# Altium footprint library AltiumLibraries.PcbLib: 247 footprints (part 4 of 16)
Each footprint in its own frame and in the unit in brackets; x right, y up, seen from the top. Pads: shape width x height; smd on the part's side, far side on the other; paste and mask are expansions set on the pad; w line width, h text height; cw(c..) or ccw(c..) is an arc to the next point about the centre after c.
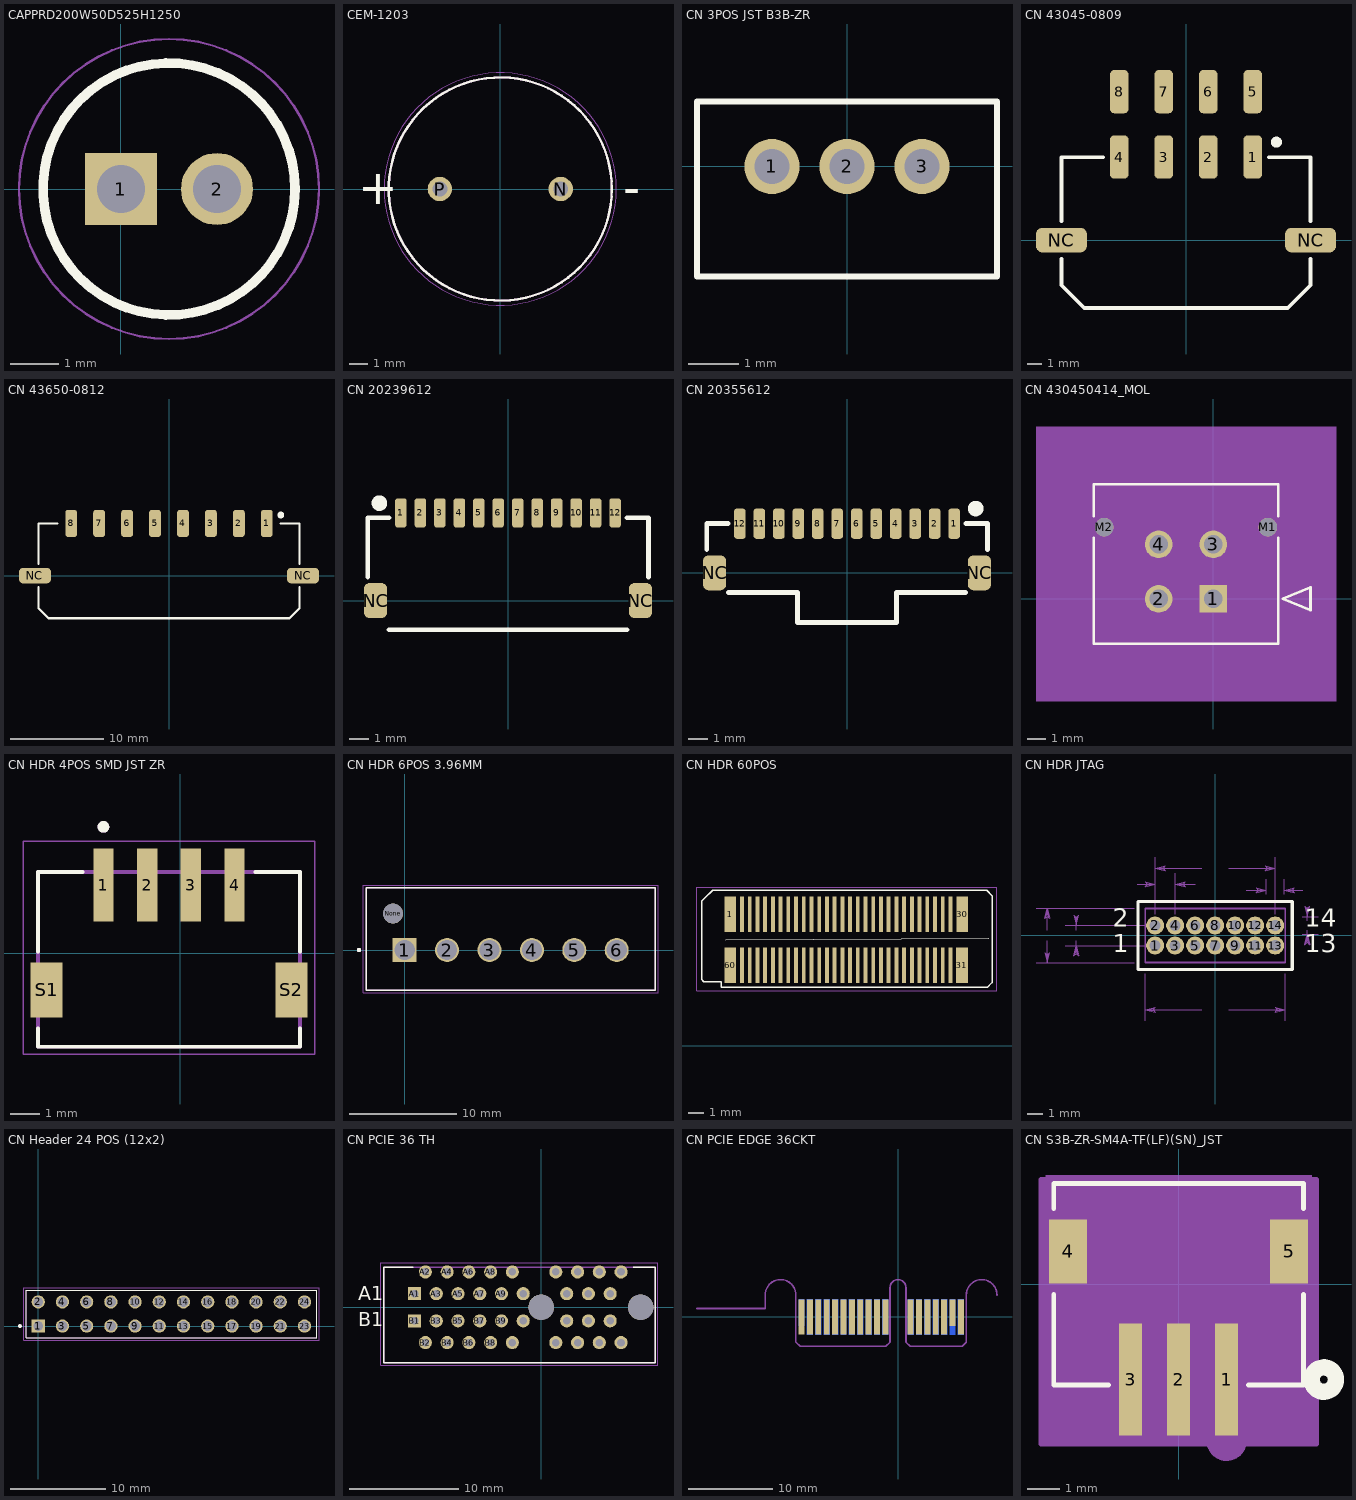
[diagram p3: the footprints below, top view; thin cyan lines are the x and y axes]

## CAPPRD200W50D525H1250 [mm]
pads (2):
  rect 1.5x1.5 hole 1: 1(0,0)
  round 1.5 hole 1: 2(2,0)
Top Overlay:
  circle w0.2: c1,0 r2.625
Mechanical 13:
  circle w0.1: c1,0 r2.625
Mechanical 15:
  circle w0.05: c1,0 r3.125
3D body "UKL2A0R1KDD.stp": height 12.5, standoff -10, extent -1.75,-2.75 3.75,2.75

## CEM-1203 [mm] "2048 Hz Speaker"
pads (2):
  round 1.308 hole 0.8: N(3.25,0) P(-3.25,0)
Top Overlay:
  circle w0.127: c0,0 r6
  text "-" at 6.608,-0.821 h1.88
  text "+" at -7.655,-0.821 h1.88
Mechanical 13:
  circle w0.127: c0,0 r6
  circle w0.127: c0,0 r6
Mechanical 16:
  circle w0.05: c0,0 r6.25
3D body "CEM-1203_42_WR.stp": height 9.1, standoff -5, extent -6.25,-6.251 6.25,6.249

## CN 3POS JST B3B-ZR [mm]
pads (3):
  round 1.1 hole 0.7: 1(-1.5,0) 2(0,0) 3(1.5,0)
Top Overlay:
  lines w0.127: -3,-2.2 3,-2.2 3,1.3 -3,1.3 -3,-2.2
3D body "step_temp.STEP": height 4.5, standoff -2.7, extent -3,-2.159 3,1.341

## CN 43045-0809 [mm] "Molex Micro-Fit 043045 SMD 8CKT"
pads (10):
  rrect50% 1.27x2.921 smd: 1(4.5,5.6) 2(1.5,5.6) 3(-1.5,5.6) 4(-4.5,5.6) 5(4.5,10) 6(1.5,10) 7(-1.5,10) 8(-4.5,10)
  rrect50% 3.429x1.651 smd: NC(-8.395,0) NC(8.395,0)
Top Overlay:
  circle w0.381: c6.096,6.604 r0.178
  lines w0.254: -8.382,-1.27 -8.382,-3.048 -6.858,-4.572 0,-4.572 6.858,-4.572 8.382,-3.048 8.382,-1.27 ; -8.382,1.27 -8.382,5.588 -5.588,5.588 ; 5.588,5.588 8.382,5.588 8.382,1.27
3D body "430450809.stp": height 8.73, standoff -0.04, extent -9.825,-4.605 9.825,10.795

## CN 43650-0812 [mm] "Molex Micro-Fit 043650 SMD 8CKT"
pads (10):
  rrect50% 1.27x2.921 smd: 1(10.5,5.6) 2(7.5,5.6) 3(4.5,5.6) 4(1.5,5.6) 5(-1.5,5.6) 6(-4.5,5.6) 7(-7.5,5.6) 8(-10.5,5.6)
  rrect50% 3.429x1.651 smd: NC(-14.385,0) NC(14.385,0)
Top Overlay:
  circle w0.381: c12,6.5 r0.178
  lines w0.254: -14,-1.27 -14,-3.5 -12.928,-4.572 0,-4.572 12.928,-4.572 14,-3.5 14,-1.27 ; -14,1.27 -14,5.588 -12,5.588 ; 12,5.588 14,5.588 14,1.27
3D body "436500812.stp": height 5.64, standoff -0.04, extent -15.82,-4.6 15.82,6.14

## CN 20239612 [mm] "12 Circuit SMD Right Angle PicoClasp"
pads (14):
  rrect50% 0.6x1.5 smd: 1(-5.5,4.5) 2(-4.5,4.5) 3(-3.5,4.5) 4(-2.5,4.5) 5(-1.5,4.5) 6(-0.5,4.5) 7(0.5,4.5) 8(1.5,4.5) 9(2.5,4.5) 10(3.5,4.5) 11(4.5,4.5) 12(5.5,4.5)
  rrect50% 1.2x1.8 smd: NC(-6.8,0) NC(6.8,0)
Top Overlay:
  circle w0.5: c-6.6,5 r0.15
  lines w0.254: -7.2,1.2 -7.2,4.25 -6.1,4.25 ; -6.1,-1.5 6.1,-1.5 ; 6.1,4.25 7.21,4.25 7.21,1.2
3D body "2023961207.stp": height 4.7, standoff 0, extent -7,-1.275 7,4.625

## CN 20355612 [mm] "12 Circuit SMD Right Angle PicoClasp"
pads (14):
  rrect50% 0.6x1.55 smd: 1(5.5,2.525) 2(4.5,2.525) 3(3.5,2.525) 4(2.5,2.525) 5(1.5,2.525) 6(0.5,2.525) 7(-0.5,2.525) 8(-1.5,2.525) 9(-2.5,2.525) 10(-3.5,2.525) 11(-4.5,2.525) 12(-5.5,2.525)
  rrect50% 1.2x1.8 smd: NC(-6.8,0) NC(6.8,0)
Top Overlay:
  circle w0.5: c6.604,3.302 r0.15
  lines w0.254: -7.2,1.2 -7.2,2.54 -6.1,2.54 ; -6.096,-1.016 -2.54,-1.016 -2.54,-2.54 2.54,-2.54 2.54,-1.016 6.096,-1.016 ; 6.1,2.54 7.21,2.54 7.21,1.2
3D body "2035561207.stp": height 5.54, standoff 0, extent -7.12,-2.435 7.12,2.9

## CN 430450414_MOL [mm]
pads (6):
  rect 1.52x1.52 hole 1.02 mask+0.076: 1(0,0)
  round 1.52 hole 1.02 mask+0.076: 2(-3,0) 3(0,3) 4(-3,3)
  round 1.02 hole 1.02 unplated mask+0.076: M1(3,3.94) M2(-6,3.94)
Top Overlay:
  lines w0.152: -6.575,3.345 -6.575,-2.47 3.575,-2.47 3.575,3.345 ; -6.575,4.535 -6.575,6.3 3.575,6.3 3.575,4.535 ; 3.829,0 5.353,0.635 5.353,-0.635 3.829,0
Mechanical 5:
  region: -9.75,9.475 6.75,9.475 6.75,-5.645 -9.75,-5.645
Mechanical 13:
  lines w0.127: -6.575,-2.47 3.575,-2.47 3.575,6.3 -6.575,6.3 -6.575,-2.47 ; 3.829,0 5.353,0.635 5.353,-0.635 3.829,0
Mechanical 15:
  region: 4.845,7.57 -7.845,7.57 -7.845,-3.74 4.845,-3.74
  lines w0.127: -7.845,-3.74 -7.845,7.57 4.845,7.57 4.845,-3.74 -7.845,-3.74
3D body: height 0.25, standoff 0, extent 0,0 0.254,0.254

## CN HDR 4POS SMD JST ZR [mm]
pads (6):
  rect 0.7x2.5 smd: 1(-2.631,2.337) 2(-1.131,2.337) 3(0.369,2.337) 4(1.869,2.337)
  rect 1.1x1.9 smd: S1(-4.581,-1.263) S2(3.819,-1.263)
Top Overlay:
  circle w0.2: c-2.631,4.337 r0.1
  lines w0.127: -4.881,-2.573 -4.881,-3.213 4.119,-3.213 4.119,-2.573 ; -4.881,0.047 -4.881,2.787 -3.351,2.787 ; 2.589,2.787 4.119,2.787 4.119,0.047
Mechanical 13:
  circle w0.2: c-2.631,4.337 r0.1
  lines w0.127: -4.881,-3.213 -4.881,2.787 4.119,2.787 4.119,-3.213 -4.881,-3.213
Mechanical 15:
  lines w0.05: -5.381,-3.463 -5.381,3.837 4.619,3.837 4.619,-3.463 -5.381,-3.463

## CN HDR 6POS 3.96MM [mm]
pads (7):
  rect 2.24x2.24 hole 1.89: 1(0,0)
  round 2.24 hole 1.89: 2(3.96,0) 3(7.92,0) 4(11.88,0) 5(15.84,0) 6(19.8,0)
  round 1.86 hole 1.86 unplated: None(-1.08,3.4)
Top Overlay:
  circle w0.2: c-4.255,0 r0.1
  lines w0.127: -3.605,-3.76 23.405,-3.76 23.405,5.82 -3.605,5.82 -3.605,-3.76
Mechanical 4:
  circle w0.2: c-4.255,0 r0.1
  circle w0.2: c-4.255,0 r0.1
  lines w0.127: -3.605,-3.76 -3.605,5.82 ; -3.605,-3.76 23.405,-3.76 ; -3.605,-3.76 -3.605,5.82 ; -3.605,-3.76 -3.605,5.82 ; -3.605,-3.76 23.405,-3.76 ; -3.605,-3.76 -3.605,5.82 ; -3.605,5.82 23.405,5.82 ; -3.605,5.82 23.405,5.82 ; -3.605,5.82 23.405,5.82 ; -3.605,5.82 23.405,5.82 ; 23.405,-3.76 23.405,5.82 ; 23.405,-3.76 23.405,5.82 ; 23.405,-3.76 23.405,5.82 ; 23.405,-3.76 23.405,5.82
Mechanical 15:
  lines w0.05: -3.855,-4.01 23.655,-4.01 23.655,6.07 -3.855,6.07 -3.855,-4.01

## CN HDR 60POS [mm] "60 Position Connector Header, Outer Shroud Contacts Surface Mount Gold"
pads (60):
  rect 0.75x2.3 smd: 1(-548,8.51) 30(-532.98,8.51) 31(-533,5.21) 60(-548,5.21)
  rect 0.25x2.3 smd: 2(-547.25,8.51) 3(-546.75,8.51) 4(-546.25,8.51) 5(-545.75,8.51) 6(-545.25,8.51) 7(-544.75,8.51) 8(-544.25,8.51) 9(-543.75,8.51) 10(-543.25,8.51) 11(-542.75,8.51) 12(-542.25,8.51) 13(-541.75,8.51) 14(-541.25,8.51) 15(-540.75,8.51) 16(-540.25,8.51) 17(-539.75,8.51) 18(-539.25,8.51) 19(-538.75,8.51) 20(-538.25,8.51) 21(-537.75,8.51) 22(-537.25,8.51) 23(-536.75,8.51) 24(-536.25,8.51) 25(-535.75,8.51) 26(-535.25,8.51) 27(-534.75,8.51) 28(-534.25,8.51) 29(-533.75,8.51) 32(-533.75,5.21) 33(-534.25,5.21) 34(-534.75,5.21) 35(-535.25,5.21) 36(-535.75,5.21) 37(-536.25,5.21) 38(-536.75,5.21) 39(-537.25,5.21) 40(-537.75,5.21) 41(-538.25,5.21) 42(-538.75,5.21) 43(-539.25,5.21) 44(-539.75,5.21) 45(-540.25,5.21) 46(-540.75,5.21) 47(-541.25,5.21) 48(-541.75,5.21) 49(-542.25,5.21) 50(-542.75,5.21) 51(-543.25,5.21) 52(-543.75,5.21) 53(-544.25,5.21) 54(-544.75,5.21) 55(-545.25,5.21) 56(-545.75,5.21) 57(-546.25,5.21) 58(-546.75,5.21) 59(-547.25,5.21)
Top Overlay:
  lines w0.05: -548.31,6.86 -531.28,6.97
  lines w0.1: -549.87,4.31 -549.72,4.16 -548.59,4.16 -548.59,3.8 -532.25,3.8 -531.35,3.8 -531.05,4.1 -531.05,9.67 -531.05,9.73 -531.4,10.08 -532.12,10.08 -548.26,10.08 -549.15,10.08 -549.67,9.56 -549.87,9.36 -549.87,4.31
Mechanical 15:
  lines w0.051: -550.164,3.556 -550.164,9.271 -550.164,10.287 -530.733,10.287 -530.733,3.556 -550.164,3.556
3D body: height 0.25, standoff 0, extent -549.58,4.525 -531.44,9.415

## CN HDR JTAG [mil] "CONN HEADER VERT 14POS 1.27MM"
pads (14):
  round 45 hole 27.95: 1(-150,-25.39) 2(-150,24.61) 3(-100,-25.39) 4(-100,24.61) 5(-50,-25.39) 6(-50,24.61) 7(0,-25.39) 8(0,24.61) 9(50,-25.39) 10(50,24.61) 11(100,-25.39) 12(100,24.61) 13(150,-25.39) 14(150,24.61)
Top Overlay:
  lines w7.87: -192.72,-85.63 -192.72,84.85 192.72,84.85 192.72,-85.63 -192.72,-85.63
  text "1" at -256.02,-57.4 h77.5
  text "2" at -256.02,6.62 h77.5
  text "13" at 224.53,-57.4 h77.5
  text "14" at 224.53,6.62 h77.5
Top Solder:
  circle w0: c-150,-25.39 r24.51
  circle w0: c-150,24.61 r24.51
  circle w0: c-100,-25.39 r24.51
  circle w0: c-100,24.61 r24.51
  circle w0: c-50,-25.39 r24.51
  circle w0: c-50,24.61 r24.51
  circle w0: c0,-25.39 r24.51
  circle w0: c0,24.61 r24.51
  circle w0: c50,-25.39 r24.51
  circle w0: c50,24.61 r24.51
  circle w0: c100,-25.39 r24.51
  circle w0: c100,24.61 r24.51
  circle w0: c150,-25.39 r24.51
  circle w0: c150,24.61 r24.51
Bottom Solder:
  circle w0: c-150,-25.39 r24.51
  circle w0: c-150,24.61 r24.51
  circle w0: c-100,-25.39 r24.51
  circle w0: c-100,24.61 r24.51
  circle w0: c-50,-25.39 r24.51
  circle w0: c-50,24.61 r24.51
  circle w0: c0,-25.39 r24.51
  circle w0: c0,24.61 r24.51
  circle w0: c50,-25.39 r24.51
  circle w0: c50,24.61 r24.51
  circle w0: c100,-25.39 r24.51
  circle w0: c100,24.61 r24.51
  circle w0: c150,-25.39 r24.51
  circle w0: c150,24.61 r24.51
Mechanical 15:
  lines w3.94: -175,-67.87 -125,-67.87 ; -175,-67.87 -125,-67.87 ; -175,-67.87 -175,67.09 -125,67.09 -75,67.09 -25,67.09 25,67.09 75,67.09 125,67.09 175,67.09 175,-67.87 125,-67.87 ; -125,-67.87 -75,-67.87 ; -125,-67.87 -75,-67.87 ; -75,-67.87 -25,-67.87 ; -75,-67.87 -25,-67.87 ; -25,-67.87 25,-67.87 ; -25,-67.87 25,-67.87 ; 25,-67.87 75,-67.87 ; 25,-67.87 75,-67.87 ; 75,-67.87 125,-67.87 ; 75,-67.87 125,-67.87
Mechanical 16:
  lines w3.94: -175,67.09 -125,67.09 -75,67.09 -25,67.09 25,67.09 75,67.09 125,67.09 ; -157.99,-33.38 -157.99,-17.4 ; -157.99,-33.38 -142.01,-33.38 ; -157.99,-33.38 -142.01,-33.38 ; -157.99,-33.38 -157.99,-17.4 ; -157.99,-17.4 -142.01,-17.4 ; -157.99,-17.4 -142.01,-17.4 ; -157.99,16.62 -157.99,32.6 ; -157.99,16.62 -142.01,16.62 ; -157.99,16.62 -142.01,16.62 ; -157.99,16.62 -157.99,32.6 ; -157.99,32.6 -142.01,32.6 ; -157.99,32.6 -142.01,32.6 ; -142.01,-33.38 -142.01,-17.4 ; -142.01,-33.38 -142.01,-17.4 ; -142.01,16.62 -142.01,32.6 ; -142.01,16.62 -142.01,32.6 ; -107.99,-33.38 -107.99,-17.4 ; -107.99,-33.38 -92.01,-33.38 ; -107.99,-33.38 -92.01,-33.38 ; -107.99,-33.38 -107.99,-17.4 ; -107.99,-17.4 -92.01,-17.4 ; -107.99,-17.4 -92.01,-17.4 ; -107.99,16.62 -107.99,32.6 ; -107.99,16.62 -92.01,16.62 ; -107.99,16.62 -92.01,16.62 ; -107.99,16.62 -107.99,32.6 ; -107.99,32.6 -92.01,32.6 ; -107.99,32.6 -92.01,32.6 ; -92.01,-33.38 -92.01,-17.4 ; -92.01,-33.38 -92.01,-17.4 ; -92.01,16.62 -92.01,32.6 ; -92.01,16.62 -92.01,32.6 ; -57.99,-33.38 -57.99,-17.4 ; -57.99,-33.38 -42.01,-33.38 ; -57.99,-33.38 -42.01,-33.38 ; -57.99,-33.38 -57.99,-17.4 ; -57.99,-17.4 -42.01,-17.4 ; -57.99,-17.4 -42.01,-17.4 ; -57.99,16.62 -57.99,32.6 ; -57.99,16.62 -42.01,16.62 ; -57.99,16.62 -42.01,16.62 ; -57.99,16.62 -57.99,32.6 ; -57.99,32.6 -42.01,32.6 ; -57.99,32.6 -42.01,32.6 ; -42.01,-33.38 -42.01,-17.4 ; -42.01,-33.38 -42.01,-17.4 ; -42.01,16.62 -42.01,32.6 ; -42.01,16.62 -42.01,32.6 ; -7.99,-33.38 -7.99,-17.4 ; -7.99,-33.38 7.99,-33.38 ; -7.99,-33.38 7.99,-33.38 ; -7.99,-33.38 -7.99,-17.4 ; -7.99,-17.4 7.99,-17.4 ; -7.99,-17.4 7.99,-17.4 ; -7.99,16.62 -7.99,32.6 ; -7.99,16.62 7.99,16.62 ; -7.99,16.62 7.99,16.62 ; -7.99,16.62 -7.99,32.6 ; -7.99,32.6 7.99,32.6 ; -7.99,32.6 7.99,32.6 ; 7.99,-33.38 7.99,-17.4 ; 7.99,-33.38 7.99,-17.4 ; 7.99,16.62 7.99,32.6 ; 7.99,16.62 7.99,32.6 ; 42.01,-33.38 42.01,-17.4 ; 42.01,-33.38 57.99,-33.38 ; 42.01,-33.38 57.99,-33.38 ; 42.01,-33.38 42.01,-17.4 ; 42.01,-17.4 57.99,-17.4 ; 42.01,-17.4 57.99,-17.4 ; 42.01,16.62 42.01,32.6 ; 42.01,16.62 57.99,16.62 ; 42.01,16.62 57.99,16.62 ; 42.01,16.62 42.01,32.6 ; 42.01,32.6 57.99,32.6 ; 42.01,32.6 57.99,32.6 ; 57.99,-33.38 57.99,-17.4 ; 57.99,-33.38 57.99,-17.4 ; 57.99,16.62 57.99,32.6 ; 57.99,16.62 57.99,32.6 ; 92.01,-33.38 92.01,-17.4 ; 92.01,-33.38 107.99,-33.38 ; 92.01,-33.38 107.99,-33.38 ; 92.01,-33.38 92.01,-17.4 ; 92.01,-17.4 107.99,-17.4 ; 92.01,-17.4 107.99,-17.4 ; 92.01,16.62 92.01,32.6 ; 92.01,16.62 107.99,16.62 ; 92.01,16.62 107.99,16.62 ; 92.01,16.62 92.01,32.6 ; 92.01,32.6 107.99,32.6 ; 92.01,32.6 107.99,32.6 ; 107.99,-33.38 107.99,-17.4 ; 107.99,-33.38 107.99,-17.4 ; 107.99,16.62 107.99,32.6 ; 107.99,16.62 107.99,32.6 ; 142.01,-33.38 157.99,-33.38 157.99,-17.4 142.01,-17.4 142.01,-33.38 ; 142.01,16.62 157.99,16.62 157.99,32.6 142.01,32.6 142.01,16.62
  text "1" at -256.02,-57.4 h77.5
  text "2" at -256.02,6.62 h77.5
  text "13" at 224.53,-57.4 h77.5
  text "14" at 224.53,6.62 h77.5
Mechanical 40:
  drawing of 154 lines, arcs and shapes, not listed
  text "1.270" at -373.5,-5.39 h15.5
  text "3.429" at -445.98,-5.39 h15.5
  text "1.270" at -253.5,122.13 h15.5
  text "8.890" at -25.98,-190.39 h15.5
  text "7.620" at -25.98,162.13 h15.5
  text "1.143" at 204.02,19.61 h15.5
  text "1.143" at 226.5,107.09 h15.5
3D body "FTSH-107-04-L-D.stp": height 249, standoff -90, extent -174.99,-67.89 175,67.11

## CN Header 24 POS (12x2) [mm] "24 position, dual row, standard 0.1\" (2.54mm) spacing."
pads (24):
  rect 1.39x1.39 hole 1.04: 1(0,0)
  round 1.39 hole 1.04: 2(0,2.54) 3(2.54,0) 4(2.54,2.54) 5(5.08,0) 6(5.08,2.54) 7(7.62,0) 8(7.62,2.54) 9(10.16,0) 10(10.16,2.54) 11(12.7,0) 12(12.7,2.54) 13(15.24,0) 14(15.24,2.54) 15(17.78,0) 16(17.78,2.54) 17(20.32,0) 18(20.32,2.54) 19(22.86,0) 20(22.86,2.54) 21(25.4,0) 22(25.4,2.54) 23(27.94,0) 24(27.94,2.54)
Top Overlay:
  circle w0.2: c-1.92,0 r0.1
  lines w0.127: -1.27,-1.23 -1.27,3.77 29.21,3.77 29.21,-1.23 -1.27,-1.23
Mechanical 13:
  circle w0.2: c-1.92,0 r0.1
  lines w0.127: -1.27,-1.23 -1.27,3.77 ; -1.27,-1.23 29.21,-1.23 ; -1.27,-1.23 -1.27,3.77 ; -1.27,3.77 29.21,3.77 ; -1.27,3.77 29.21,3.77 ; 29.21,-1.23 29.21,3.77 ; 29.21,-1.23 29.21,3.77
Mechanical 15:
  lines w0.05: -1.52,-1.48 -1.52,4.02 29.46,4.02 29.46,-1.48 -1.52,-1.48

## CN PCIE 36 TH [mm] "AMPHENOL_10018784-10210TLF"
pads (38):
  rect 1.208x1.208 hole 0.7: A1(-11.65,1.25) B1(-11.65,-1.25)
  round 1.208 hole 0.7: A2(-10.65,3.25) A3(-9.65,1.25) A4(-8.65,3.25) A5(-7.65,1.25) A6(-6.65,3.25) A7(-5.65,1.25) A8(-4.65,3.25) A9(-3.65,1.25) A10(-2.65,3.25) A11(-1.65,1.25) A12(1.35,3.25) A13(2.35,1.25) A14(3.35,3.25) A15(4.35,1.25) A16(5.35,3.25) A17(6.35,1.25) A18(7.35,3.25) B2(-10.65,-3.25) B3(-9.65,-1.25) B4(-8.65,-3.25) B5(-7.65,-1.25) B6(-6.65,-3.25) B7(-5.65,-1.25) B8(-4.65,-3.25) B9(-3.65,-1.25) B10(-2.65,-3.25) B11(-1.65,-1.25) B12(1.35,-3.25) B13(2.35,-1.25) B14(3.35,-3.25) B15(4.35,-1.25) B16(5.35,-3.25) B17(6.35,-1.25) B18(7.35,-3.25)
  round 2.35 hole 2.35 unplated: ""(0,0) ""(9.15,0)
Top Overlay:
  lines w0.127: -11.75,3.7 -14.5,3.7 -14.5,-5.1 10.5,-5.1 10.5,3.7 8.45,3.7
  text "A1" at -16.85,0.65 h1.27
  text "B1" at -16.85,-1.75 h1.27
Mechanical 13:
  lines w0.127: -14.5,-5.1 10.5,-5.1 10.5,3.7 -14.5,3.7 -14.5,-5.1
  text "A1" at -16.85,0.65 h1.27
  text "B1" at -16.85,-1.75 h1.27
Mechanical 15:
  lines w0.05: -14.75,-5.35 10.75,-5.35 10.75,4.11 -14.75,4.11 -14.75,-5.35
3D body "10018784-10210TLF--3DModel-STEP-56544.STEP": height 11, standoff -4.4, extent -14.6,-5.1 10.4,3.7

## CN PCIE EDGE 36CKT [mm] "PCIE X1 36pin card edge"
pads (36):
  rect 0.7x3.2 smd far side paste-1: A1(-11.5,0.5)
  rect 0.7x4.2 smd far side paste-1: A2(-10.5,0) A3(-9.5,0) A4(-8.5,0) A5(-7.5,0) A6(-6.5,0) A7(-5.5,0) A8(-4.5,0) A9(-3.5,0) A10(-2.5,0) A11(-1.5,0) A12(1.5,0) A13(2.5,0) A14(3.5,0) A15(4.5,0) A16(5.5,0) A17(6.5,0) A18(7.5,0)
  rect 0.7x4.2 smd paste-1: B1(-11.5,0) B2(-10.5,0) B3(-9.5,0) B4(-8.5,0) B5(-7.5,0) B6(-6.5,0) B7(-5.5,0) B8(-4.5,0) B9(-3.5,0) B10(-2.5,0) B11(-1.5,0) B12(1.5,0) B13(2.5,0) B14(3.5,0) B15(4.5,0) B16(5.5,0) B18(7.5,0)
  rect 0.7x3.2 smd paste-1: B17(6.5,0.5)
Top Solder:
  rectangle: -12.4,-3.75 8.4,2.225
Bottom Solder:
  rectangle: -12.4,-3.75 8.4,2.225
Mechanical 1:
  lines w0.203: -12.175,-2.975 -12.15,-3
Mechanical 15:
  lines w0.203: -23.958,1 -15.825,1 -15.825,2.625 cw(c-14,2.625) -12.175,2.625 -12.175,-2.975 ; -12.15,-3 -11.65,-3.5 -1.45,-3.5 -0.95,-3 -0.95,3.5 cw(c0,3.5) 0.95,3.5 0.95,-3 1.45,-3.5 7.65,-3.5 8.15,-3 8.15,2.625 cw(c9.975,2.625) 11.8,2.625

## CN S3B-ZR-SM4A-TF(LF)(SN)_JST [mil]
pads (5):
  rect 28x138 smd paste+0 mask+0: 1(59,-117.22) 2(0,-117.22) 3(-59,-117.22)
  rect 47x79 smd: 4(-135.83,40.26) 5(135.83,40.26)
Top Overlay:
  circle w20: c178.5,-117.22 r15
  lines w6: -153.5,-12.34 -153.5,-124 -86.1,-124 ; -153.5,92.86 -153.5,124 153.5,124 153.5,92.86 ; 86.1,-124 153.5,-124 153.5,-12.34
Bottom Overlay:
  circle w20: c178.5,-117.22 r15
Mechanical 5:
  region: -163.5,134 163.5,134 163.5,-134 -163.5,-134
Mechanical 13:
  circle w20: c59,-192.22 r15
  lines w1: -148.5,-119 -148.5,119 148.5,119 148.5,-119 -148.5,-119
Mechanical 15:
  region: 169.33,129 -169.33,129 -169.33,-196.22 169.33,-196.22
  lines w6: -169.33,-196.22 169.33,-196.22 169.33,129 -169.33,129 -169.33,-196.22
3D body: height 10, standoff 0, extent 0,0 10,10